# Altium schematic symbol library TTL74系列.SchLib: 649 symbols (part 4 of 6)
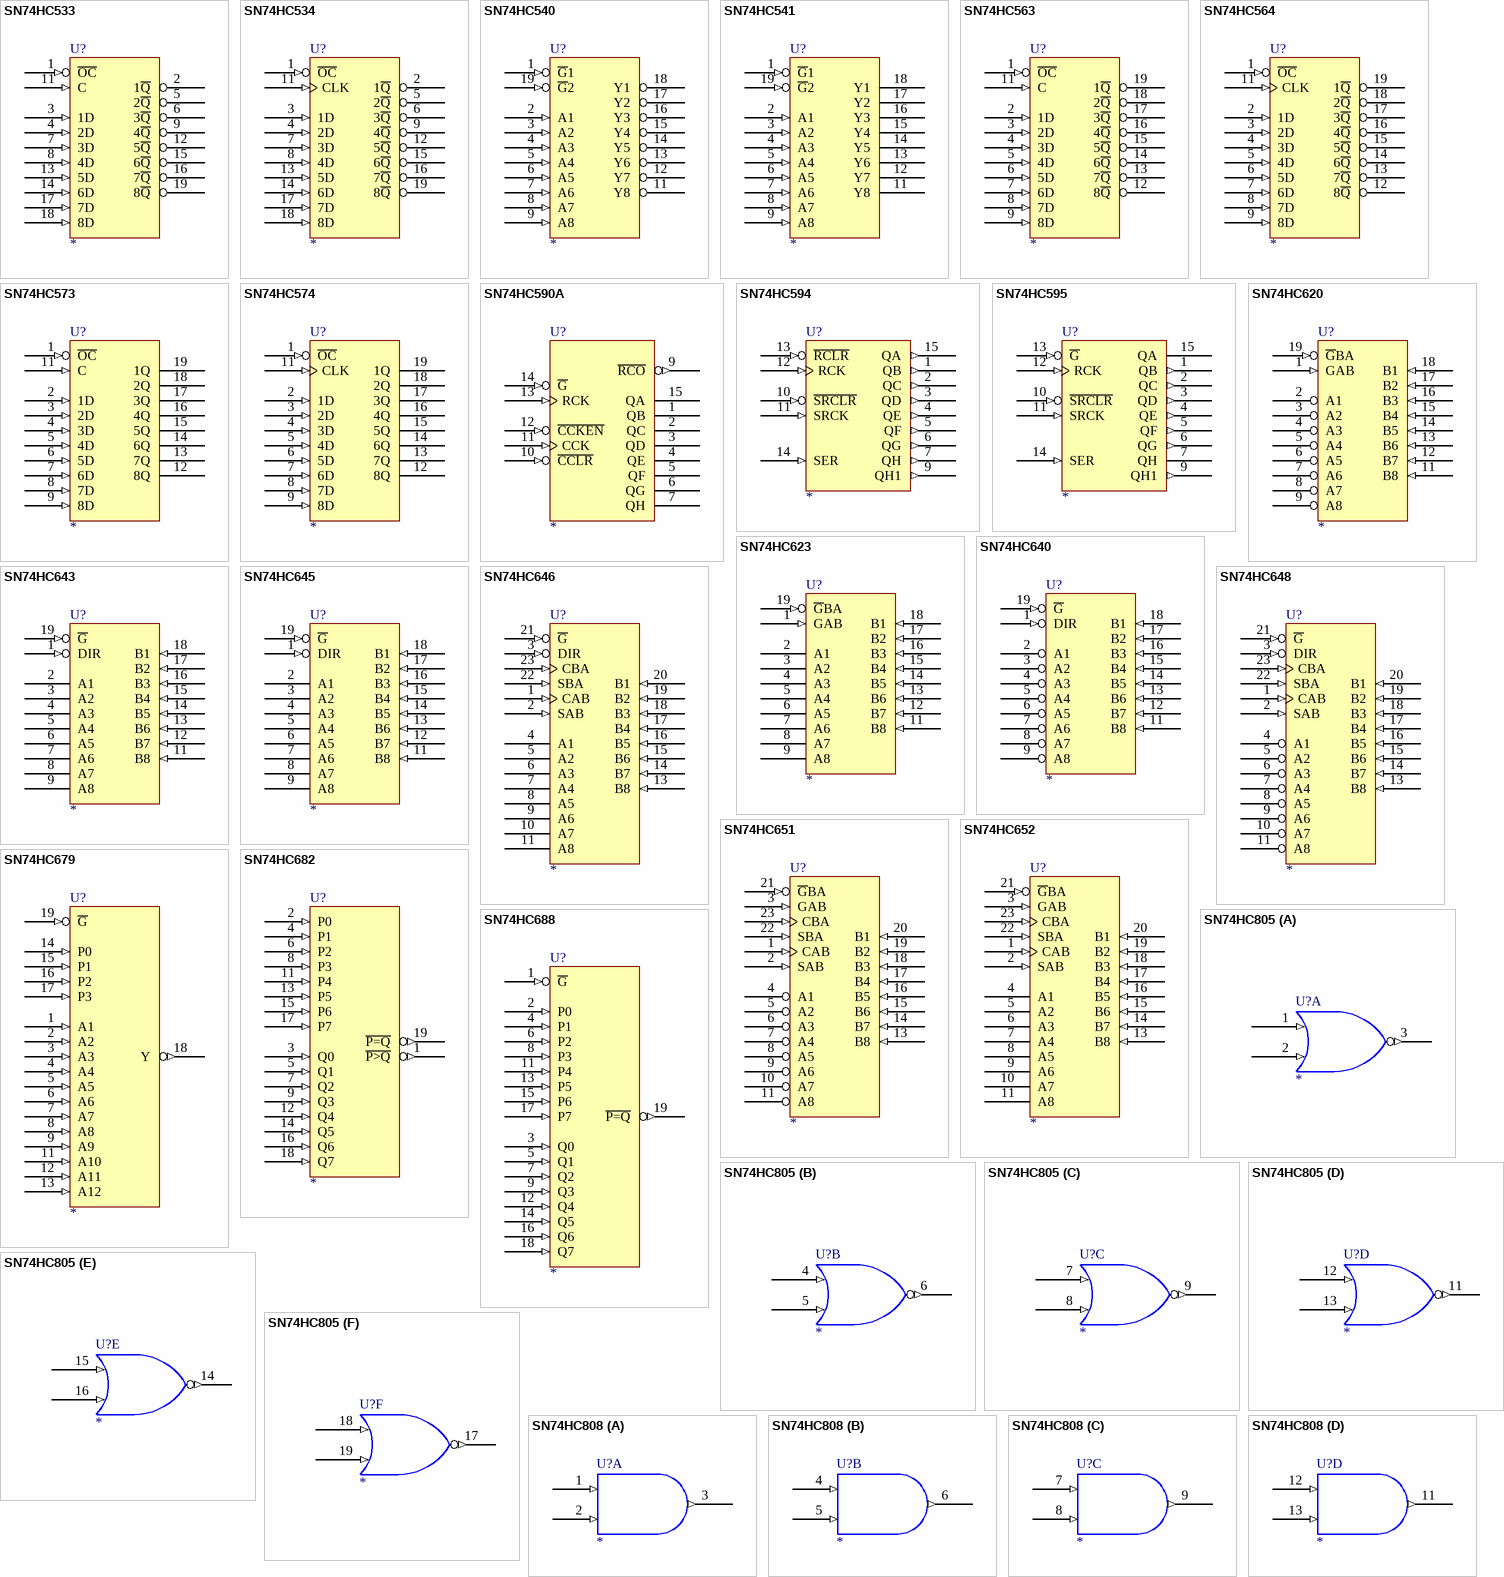
[diagram p33: symbols SN74HC533 to SN74HC808]

## SN74HC682
designator U?
8-BIT MAGNITUDE/IDENTITY COMPARATOR
footprint SO20W
footprint DIP-20
pins: 1 ~{P>Q} (out), 2 P0 (in), 3 Q0 (in), 4 P1 (in), 5 Q1 (in), 6 P2 (in), 7 Q2 (in), 8 P3 (in), 9 Q3 (in), 10 GND (power) hidden to GND, 11 P4 (in), 12 Q4 (in), 13 P5 (in), 14 Q5 (in), 15 P6 (in), 16 Q6 (in), 17 P7 (in), 18 Q7 (in), 19 ~{P=Q} (out), 20 VCC (power) hidden to VCC
1 alternate drawing of the same symbol

## SN74HC688
designator U?
8-BIT IDENTITY COMPARATOR
footprint SO20W
footprint DIP-20
pins: 1 ~{G} (in), 2 P0 (in), 3 Q0 (in), 4 P1 (in), 5 Q1 (in), 6 P2 (in), 7 Q2 (in), 8 P3 (in), 9 Q3 (in), 10 GND (power) hidden to GND, 11 P4 (in), 12 Q4 (in), 13 P5 (in), 14 Q5 (in), 15 P6 (in), 16 Q6 (in), 17 P7 (in), 18 Q7 (in), 19 ~{P=Q} (out), 20 VCC (power) hidden to VCC
1 alternate drawing of the same symbol

## SN74HC805
designator U?
HEX 2-IN NOR DRIVERS
footprint SO20W
footprint DIP-20
part A pins: 1 (in), 2 (in), 3 (out), 10 GND (power) hidden to GND, 20 VCC (power) hidden to VCC
part B pins: 4 (in), 5 (in), 6 (out), 10 GND (power) hidden to GND, 20 VCC (power) hidden to VCC
part C pins: 7 (in), 8 (in), 9 (out), 10 GND (power) hidden to GND, 20 VCC (power) hidden to VCC
part D pins: 10 GND (power) hidden to GND, 11 (out), 12 (in), 13 (in), 20 VCC (power) hidden to VCC
part E pins: 10 GND (power) hidden to GND, 14 (out), 15 (in), 16 (in), 20 VCC (power) hidden to VCC
part F pins: 10 GND (power) hidden to GND, 17 (out), 18 (in), 19 (in), 20 VCC (power) hidden to VCC
2 alternate drawings of the same symbol

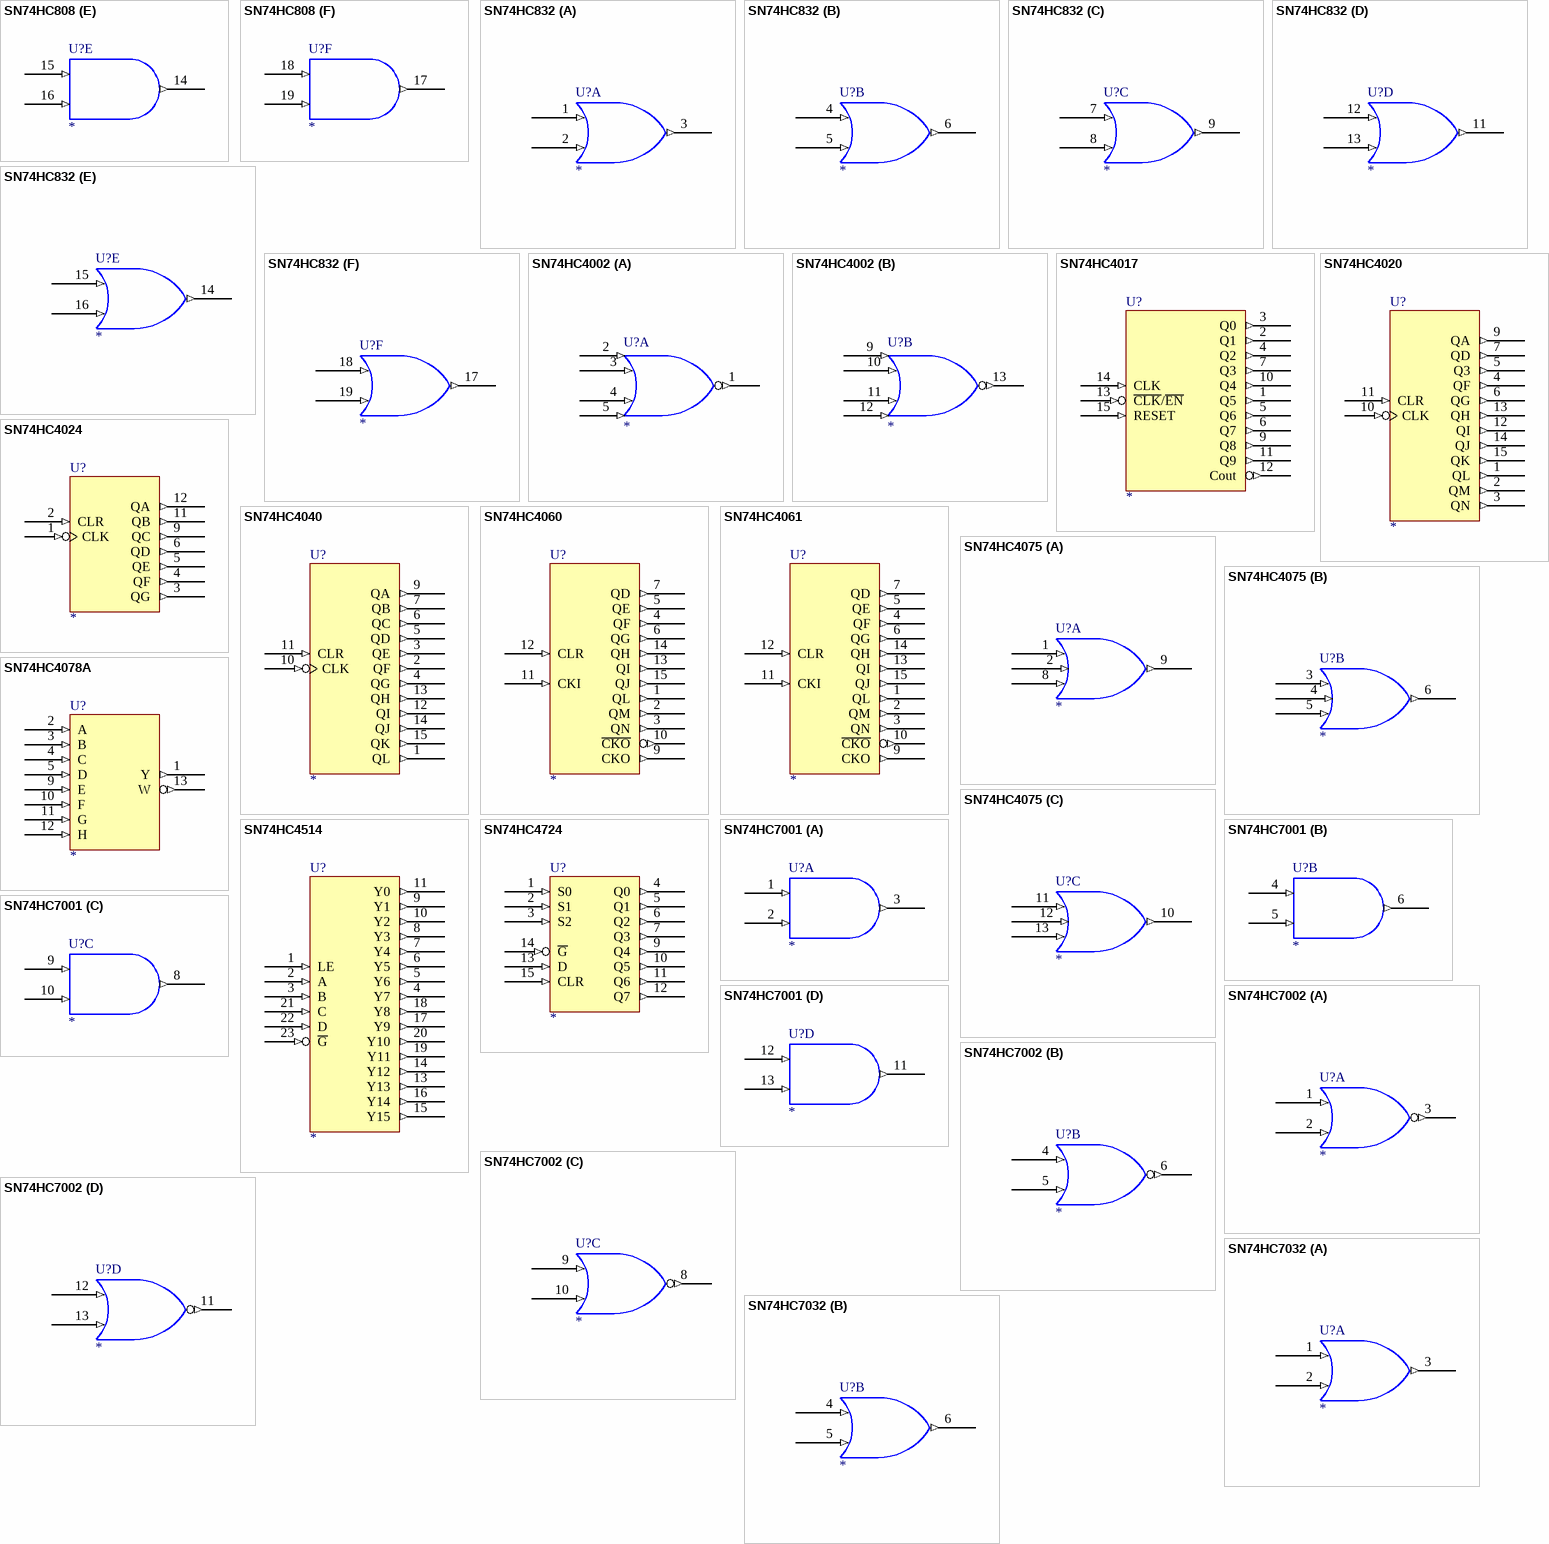
[diagram p16: symbols SN74HC808 to SN74HC7032]

## SN74HC808
designator U?
HEX 2-IN AND DRIVERS
footprint SO20W
footprint DIP-20
part A pins: 1 (in), 2 (in), 3 (out), 10 GND (power) hidden to GND, 20 VCC (power) hidden to VCC
part B pins: 4 (in), 5 (in), 6 (out), 10 GND (power) hidden to GND, 20 VCC (power) hidden to VCC
part C pins: 7 (in), 8 (in), 9 (out), 10 GND (power) hidden to GND, 20 VCC (power) hidden to VCC
part D pins: 10 GND (power) hidden to GND, 11 (out), 12 (in), 13 (in), 20 VCC (power) hidden to VCC
part E pins: 10 GND (power) hidden to GND, 14 (out), 15 (in), 16 (in), 20 VCC (power) hidden to VCC
part F pins: 10 GND (power) hidden to GND, 17 (out), 18 (in), 19 (in), 20 VCC (power) hidden to VCC
2 alternate drawings of the same symbol

## SN74HC832
designator U?
HEX 2-IN OR DRIVERS
footprint SO20W
footprint DIP-20
part A pins: 1 (in), 2 (in), 3 (out), 10 GND (power) hidden to GND, 20 VCC (power) hidden to VCC
part B pins: 4 (in), 5 (in), 6 (out), 10 GND (power) hidden to GND, 20 VCC (power) hidden to VCC
part C pins: 7 (in), 8 (in), 9 (out), 10 GND (power) hidden to GND, 20 VCC (power) hidden to VCC
part D pins: 10 GND (power) hidden to GND, 11 (out), 12 (in), 13 (in), 20 VCC (power) hidden to VCC
part E pins: 10 GND (power) hidden to GND, 14 (out), 15 (in), 16 (in), 20 VCC (power) hidden to VCC
part F pins: 10 GND (power) hidden to GND, 17 (out), 18 (in), 19 (in), 20 VCC (power) hidden to VCC
2 alternate drawings of the same symbol

## SN74HC4002
designator U?
Dual 4-INPUT NOR GATE
footprint SO14
footprint DIP-14
part A pins: 1 (out), 2 (in), 3 (in), 4 (in), 5 (in), 7 GND (power) hidden to GND, 14 VCC (power) hidden to VCC
part B pins: 7 GND (power) hidden to GND, 9 (in), 10 (in), 11 (in), 12 (in), 13 (out), 14 VCC (power) hidden to VCC
2 alternate drawings of the same symbol

## SN74HC4017
designator U?
DECADE COUNTER/DIVIDER
footprint DIP-16
pins: 1 Q5 (out), 2 Q1 (out), 3 Q0 (out), 4 Q2 (out), 5 Q6 (out), 6 Q7 (out), 7 Q3 (out), 8 GND (power) hidden to GND, 9 Q8 (out), 10 Q4 (out), 11 Q9 (out), 12 Cout (out), 13 ~{CLK}/~{EN} (in), 14 CLK (in), 15 RESET (in), 16 VCC (power) hidden to VCC
1 alternate drawing of the same symbol

## SN74HC4020
designator U?
14-BIT BINARY COUNTER
footprint SO16
footprint DIP-16
pins: 1 QL (out), 2 QM (out), 3 QN (out), 4 QF (out), 5 Q3 (out), 6 QG (out), 7 QD (out), 8 GND (power) hidden to GND, 9 QA (out), 10 CLK (in), 11 CLR (in), 12 QI (out), 13 QH (out), 14 QJ (out), 15 QK (out), 16 VCC (power) hidden to VCC
1 alternate drawing of the same symbol

## SN74HC4024
designator U?
ASYNCHRONOUS 7-BIT BINARY COUNTERS
footprint SO14
footprint DIP-14
pins: 1 CLK (in), 2 CLR (in), 3 QG (out), 4 QF (out), 5 QE (out), 6 QD (out), 7 GND (power) hidden to GND, 9 QC (out), 11 QB (out), 12 QA (out), 14 VCC (power) hidden to VCC
1 alternate drawing of the same symbol

## SN74HC4040
designator U?
ASYNCHRONOUS 12-BIT BINARY COUNTERS
footprint SO16
footprint DIP-16
pins: 1 QL (out), 2 QF (out), 3 QE (out), 4 QG (out), 5 QD (out), 6 QC (out), 7 QB (out), 8 GND (power) hidden to GND, 9 QA (out), 10 CLK (in), 11 CLR (in), 12 QI (out), 13 QH (out), 14 QJ (out), 15 QK (out), 16 VCC (power) hidden to VCC
1 alternate drawing of the same symbol

## SN74HC4060
designator U?
ASYNCHRONOUS 14-STAGE BINARY COUNTERS AND OSCILATORS
footprint SO16
footprint DIP-16
pins: 1 QL (out), 2 QM (out), 3 QN (out), 4 QF (out), 5 QE (out), 6 QG (out), 7 QD (out), 8 GND (power) hidden to GND, 9 CKO (out), 10 ~{CKO} (out), 11 CKI (in), 12 CLR (in), 13 QI (out), 14 QH (out), 15 QJ (out), 16 VCC (power) hidden to VCC
1 alternate drawing of the same symbol

## SN74HC4061
designator U?
ASYNCHRONOUS 14-STAGE BINARY COUNTERS AND OSCILATORS
footprint SO16
footprint DIP-16
pins: 1 QL (out), 2 QM (out), 3 QN (out), 4 QF (out), 5 QE (out), 6 QG (out), 7 QD (out), 8 GND (power) hidden to GND, 9 CKO (out), 10 ~{CKO} (out), 11 CKI (in), 12 CLR (in), 13 QI (out), 14 QH (out), 15 QJ (out), 16 VCC (power) hidden to VCC
1 alternate drawing of the same symbol

## SN74HC4075
designator U?
TRIPLE 3-INPUT OR GATE
footprint SO14
footprint DIP-14
part A pins: 1 (in), 2 (in), 7 GND (power) hidden to GND, 8 (in), 9 (out), 14 VCC (power) hidden to VCC
part B pins: 3 (in), 4 (in), 5 (in), 6 (out), 7 GND (power) hidden to GND, 14 VCC (power) hidden to VCC
part C pins: 7 GND (power) hidden to GND, 10 (out), 11 (in), 12 (in), 13 (in), 14 VCC (power) hidden to VCC
2 alternate drawings of the same symbol

## SN74HC4078A
designator U?
8-INPUT OR/NOR GATE
footprint SO14
footprint DIP-14
pins: 1 Y (out), 2 A (in), 3 B (in), 4 C (in), 5 D (in), 7 GND (power) hidden to GND, 9 E (in), 10 F (in), 11 G (in), 12 H (in), 13 W (out), 14 VCC (power) hidden to VCC
1 alternate drawing of the same symbol

## SN74HC4514
designator U?
4-LINE TO 16-LINE DECODER/DEMULTIPLEXERS WITH ADDRESS LATCHES
footprint SO24W
footprint DIP-24
pins: 1 LE (in), 2 A (in), 3 B (in), 4 Y7 (out), 5 Y6 (out), 6 Y5 (out), 7 Y4 (out), 8 Y3 (out), 9 Y1 (out), 10 Y2 (out), 11 Y0 (out), 12 GND (power) hidden to GND, 13 Y13 (out), 14 Y12 (out), 15 Y15 (out), 16 Y14 (out), 17 Y9 (out), 18 Y8 (out), 19 Y11 (out), 20 Y10 (out), 21 C (in), 22 D (in), 23 ~{G} (in), 24 VCC (power) hidden to VCC
1 alternate drawing of the same symbol

## SN74HC4724
designator U?
8-BIT ADDRESSABLE LARCHES
footprint DIP-16
pins: 1 S0 (in), 2 S1 (in), 3 S2 (in), 4 Q0 (out), 5 Q1 (out), 6 Q2 (out), 7 Q3 (out), 8 GND (power) hidden to GND, 9 Q4 (out), 10 Q5 (out), 11 Q6 (out), 12 Q7 (out), 13 D (in), 14 ~{G} (in), 15 CLR (in), 16 VCC (power) hidden to VCC
1 alternate drawing of the same symbol

## SN74HC7001
designator U?
Quad 2-IN Pos AND G SCH INPUTS
footprint SO14
footprint DIP-14
part A pins: 1 (in), 2 (in), 3 (out), 7 GND (power) hidden to GND, 14 VCC (power) hidden to VCC
part B pins: 4 (in), 5 (in), 6 (out), 7 GND (power) hidden to GND, 14 VCC (power) hidden to VCC
part C pins: 7 GND (power) hidden to GND, 8 (out), 9 (in), 10 (in), 14 VCC (power) hidden to VCC
part D pins: 7 GND (power) hidden to GND, 11 (out), 12 (in), 13 (in), 14 VCC (power) hidden to VCC
2 alternate drawings of the same symbol

## SN74HC7002
designator U?
Quad 2-IN Pos NOR G SCH INPUTS
footprint SO14
footprint DIP-14
part A pins: 1 (in), 2 (in), 3 (out), 7 GND (power) hidden to GND, 14 VCC (power) hidden to VCC
part B pins: 4 (in), 5 (in), 6 (out), 7 GND (power) hidden to GND, 14 VCC (power) hidden to VCC
part C pins: 7 GND (power) hidden to GND, 8 (out), 9 (in), 10 (in), 14 VCC (power) hidden to VCC
part D pins: 7 GND (power) hidden to GND, 11 (out), 12 (in), 13 (in), 14 VCC (power) hidden to VCC
2 alternate drawings of the same symbol

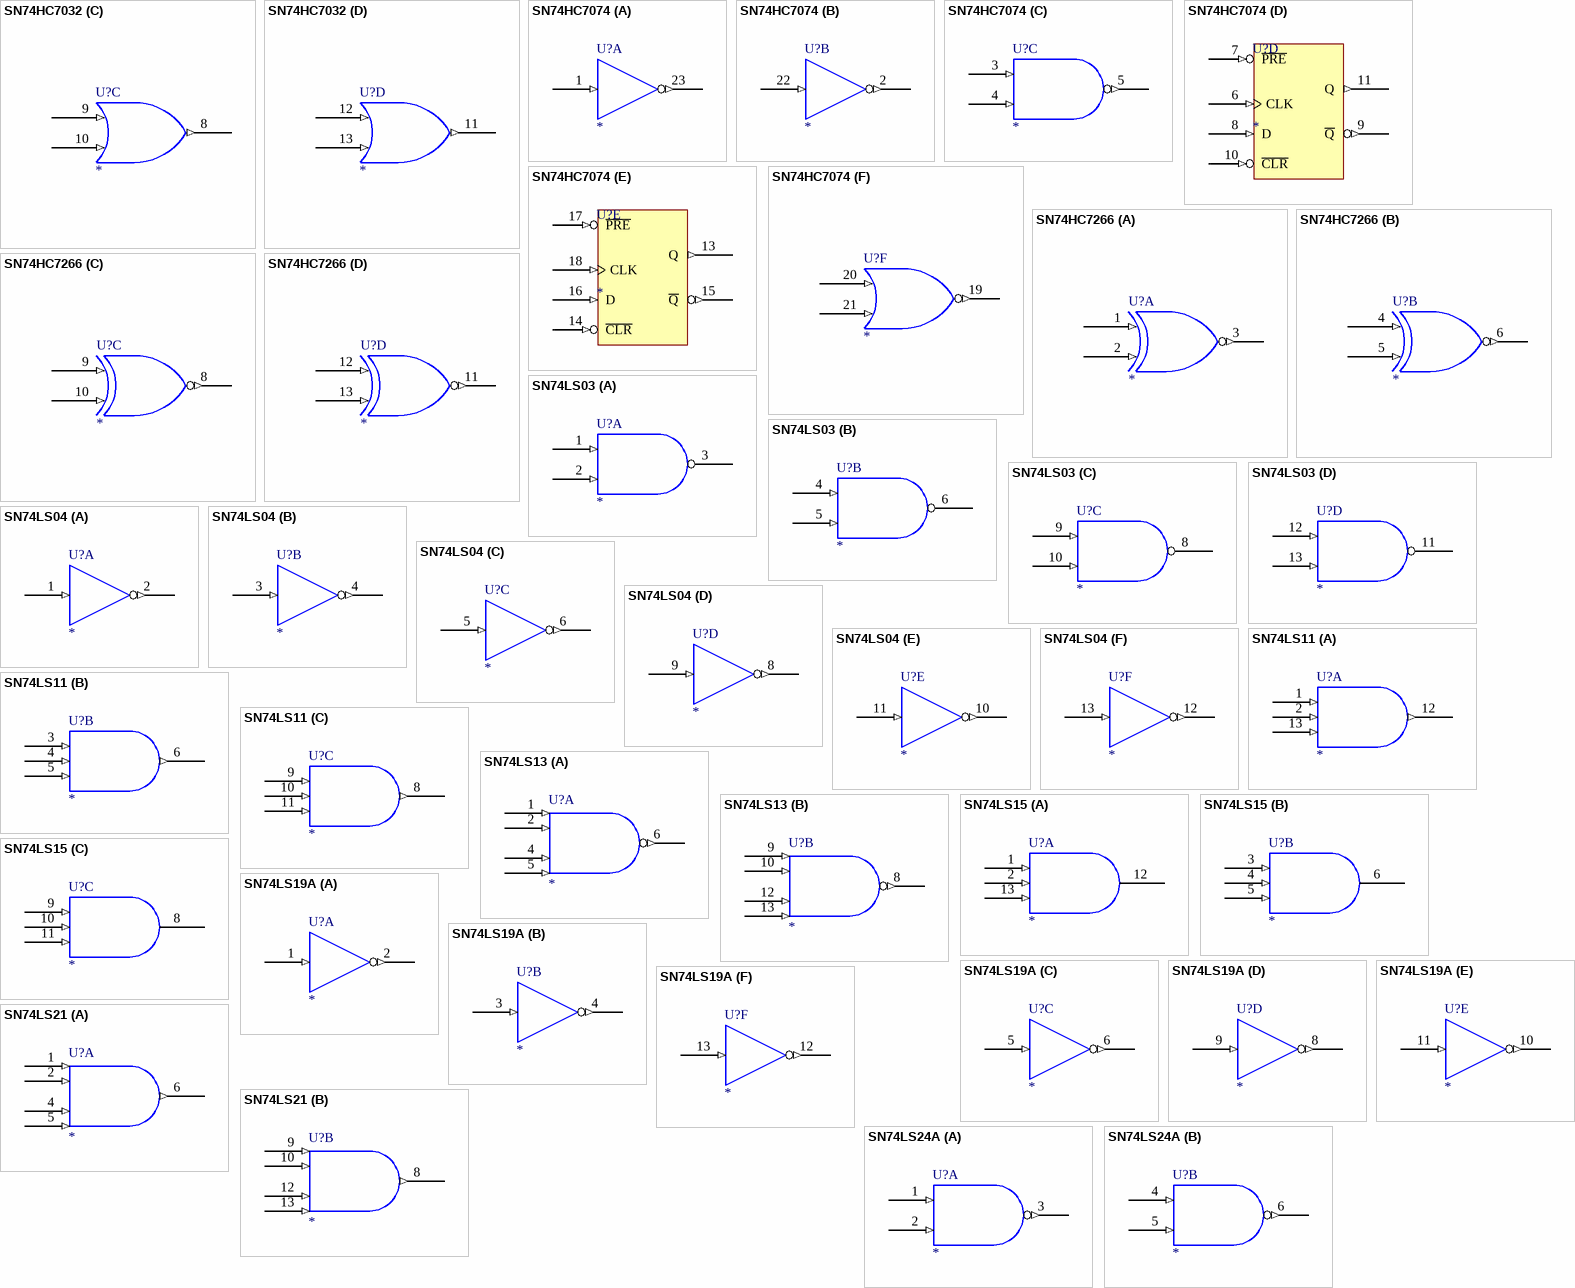
[diagram p17: symbols SN74HC7032 to SN74LS24A]

## SN74HC7032
designator U?
Quad 2-IN Pos OR G SCH INPUTS
footprint SO14
footprint DIP-14
part A pins: 1 (in), 2 (in), 3 (out), 7 GND (power) hidden to GND, 14 VCC (power) hidden to VCC
part B pins: 4 (in), 5 (in), 6 (out), 7 GND (power) hidden to GND, 14 VCC (power) hidden to VCC
part C pins: 7 GND (power) hidden to GND, 8 (out), 9 (in), 10 (in), 14 VCC (power) hidden to VCC
part D pins: 7 GND (power) hidden to GND, 11 (out), 12 (in), 13 (in), 14 VCC (power) hidden to VCC
2 alternate drawings of the same symbol

## SN74HC7074
designator U?
6-SECTION MULTIFUNCTION NAND INVERT NOR FF
footprint SO24W
footprint DIP-24
part A pins: 1 (in), 12 GND (power) hidden to GND, 23 (out), 24 VCC (power) hidden to VCC
part B pins: 2 (out), 12 GND (power) hidden to GND, 22 (in), 24 VCC (power) hidden to VCC
part C pins: 3 (in), 4 (in), 5 (out), 12 GND (power) hidden to GND, 24 VCC (power) hidden to VCC
part D pins: 6 CLK (in), 7 ~{PRE} (in), 8 D (in), 9 ~{Q} (out), 10 ~{CLR} (in), 11 Q (out), 12 GND (power) hidden to GND, 24 VCC (power) hidden to VCC
part E pins: 12 GND (power) hidden to GND, 13 Q (out), 14 ~{CLR} (in), 15 ~{Q} (out), 16 D (in), 17 ~{PRE} (in), 18 CLK (in), 24 VCC (power) hidden to VCC
part F pins: 12 GND (power) hidden to GND, 19 (out), 20 (in), 21 (in), 24 VCC (power) hidden to VCC
2 alternate drawings of the same symbol

## SN74HC7266
designator U?
QUAD 2-IN XNOR G
footprint SO14
footprint DIP-14
part A pins: 1 (in), 2 (in), 3 (out), 7 GND (power) hidden to GND, 14 VCC (power) hidden to VCC
part B pins: 4 (in), 5 (in), 6 (out), 7 GND (power) hidden to GND, 14 VCC (power) hidden to VCC
part C pins: 7 GND (power) hidden to GND, 8 (out), 9 (in), 10 (in), 14 VCC (power) hidden to VCC
part D pins: 7 GND (power) hidden to GND, 11 (out), 12 (in), 13 (in), 14 VCC (power) hidden to VCC
1 alternate drawing of the same symbol

## SN74LS03
designator U?
Quad 2-IN Pos Nand G OCO
footprint SO14
footprint DIP-14
part A pins: 1 (in), 2 (in), 3 (oc), 7 GND (power) hidden to GND, 14 VCC (power) hidden to VCC
part B pins: 4 (in), 5 (in), 6 (oc), 7 GND (power) hidden to GND, 14 VCC (power) hidden to VCC
part C pins: 7 GND (power) hidden to GND, 8 (oc), 9 (in), 10 (in), 14 VCC (power) hidden to VCC
part D pins: 7 GND (power) hidden to GND, 11 (oc), 12 (in), 13 (in), 14 VCC (power) hidden to VCC
2 alternate drawings of the same symbol

## SN74LS04
designator U?
Hex Inverters
footprint SO14
footprint DIP-14
part A pins: 1 (in), 2 (out), 7 GND (power) hidden to GND, 14 VCC (power) hidden to VCC
part B pins: 3 (in), 4 (out), 7 GND (power) hidden to GND, 14 VCC (power) hidden to VCC
part C pins: 5 (in), 6 (out), 7 GND (power) hidden to GND, 14 VCC (power) hidden to VCC
part D pins: 7 GND (power) hidden to GND, 8 (out), 9 (in), 14 VCC (power) hidden to VCC
part E pins: 7 GND (power) hidden to GND, 10 (out), 11 (in), 14 VCC (power) hidden to VCC
part F pins: 7 GND (power) hidden to GND, 12 (out), 13 (in), 14 VCC (power) hidden to VCC
2 alternate drawings of the same symbol

## SN74LS11
designator U?
Triple 3-IN Pos And G
footprint SO14
footprint DIP-14
part A pins: 1 (in), 2 (in), 7 GND (power) hidden to GND, 12 (out), 13 (in), 14 VCC (power) hidden to VCC
part B pins: 3 (in), 4 (in), 5 (in), 6 (out), 7 GND (power) hidden to GND, 14 VCC (power) hidden to VCC
part C pins: 7 GND (power) hidden to GND, 8 (out), 9 (in), 10 (in), 11 (in), 14 VCC (power) hidden to VCC
2 alternate drawings of the same symbol

## SN74LS13
designator U?
Dual 4-IN Pos Nand G SCH
footprint SO14
footprint DIP-14
part A pins: 1 (in), 2 (in), 4 (in), 5 (in), 6 (out), 7 GND (power) hidden to GND, 14 VCC (power) hidden to VCC
part B pins: 7 GND (power) hidden to GND, 8 (out), 9 (in), 10 (in), 12 (in), 13 (in), 14 VCC (power) hidden to VCC
2 alternate drawings of the same symbol

## SN74LS15
designator U?
Triple 3-IN Pos And G OCO
footprint SO14
footprint DIP-14
part A pins: 1 (in), 2 (in), 7 GND (power) hidden to GND, 12 (oc), 13 (in), 14 VCC (power) hidden to VCC
part B pins: 3 (in), 4 (in), 5 (in), 6 (oc), 7 GND (power) hidden to GND, 14 VCC (power) hidden to VCC
part C pins: 7 GND (power) hidden to GND, 8 (oc), 9 (in), 10 (in), 11 (in), 14 VCC (power) hidden to VCC
2 alternate drawings of the same symbol

## SN74LS19A
designator U?
Hex Inverter Totem
footprint SO14
footprint DIP-14
part A pins: 1 (in), 2 (out), 7 GND (power) hidden to GND, 14 VCC (power) hidden to VCC
part B pins: 3 (in), 4 (out), 7 GND (power) hidden to GND, 14 VCC (power) hidden to VCC
part C pins: 5 (in), 6 (out), 7 GND (power) hidden to GND, 14 VCC (power) hidden to VCC
part D pins: 7 GND (power) hidden to GND, 8 (out), 9 (in), 14 VCC (power) hidden to VCC
part E pins: 7 GND (power) hidden to GND, 10 (out), 11 (in), 14 VCC (power) hidden to VCC
part F pins: 7 GND (power) hidden to GND, 12 (out), 13 (in), 14 VCC (power) hidden to VCC
2 alternate drawings of the same symbol

## SN74LS21
designator U?
Dual 4-IN Pos And G
footprint SO14
footprint DIP-14
part A pins: 1 (in), 2 (in), 4 (in), 5 (in), 6 (out), 7 GND (power) hidden to GND, 14 VCC (power) hidden to VCC
part B pins: 7 GND (power) hidden to GND, 8 (out), 9 (in), 10 (in), 12 (in), 13 (in), 14 VCC (power) hidden to VCC
2 alternate drawings of the same symbol

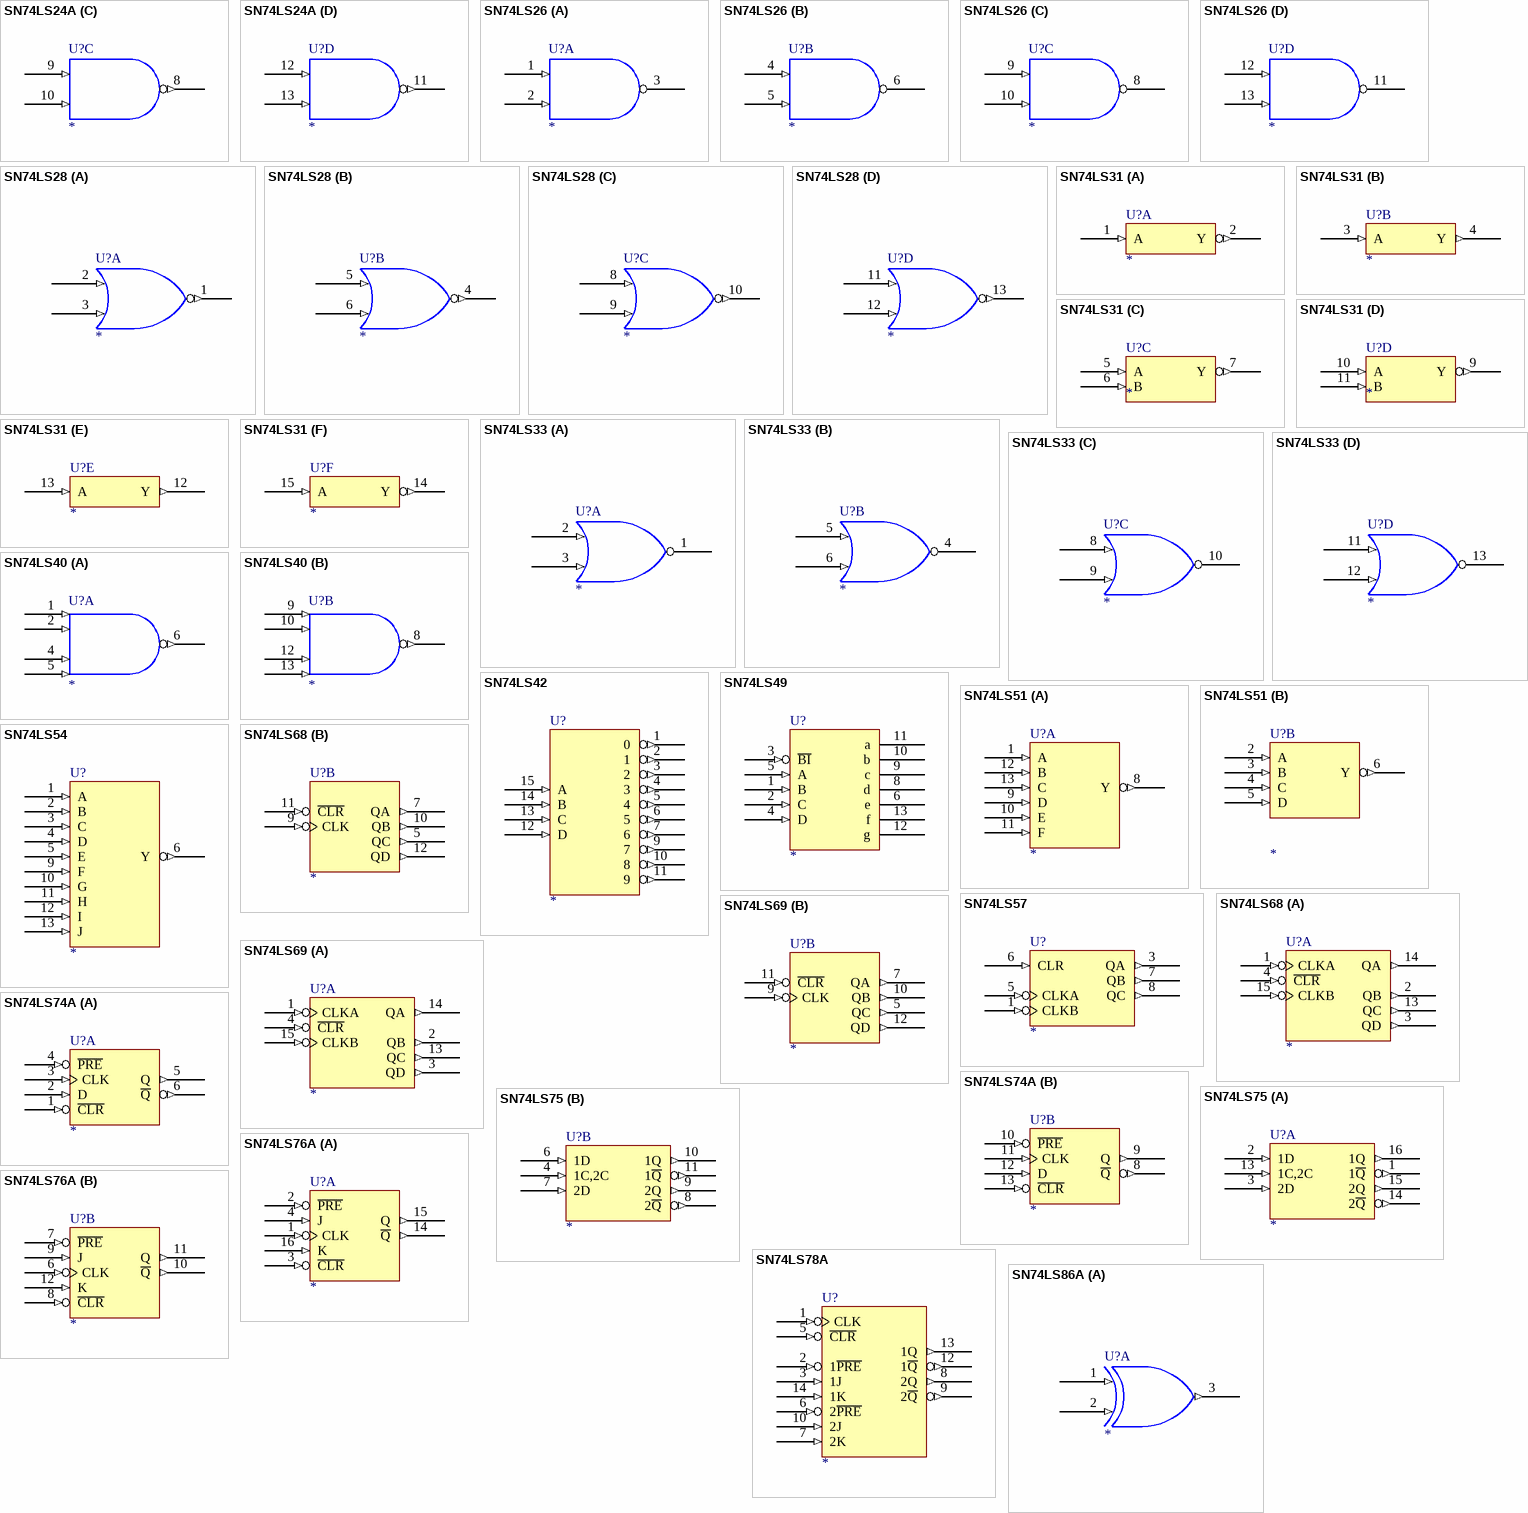
[diagram p18: symbols SN74LS24A to SN74LS86A]

## SN74LS24A
designator U?
Quad 2-IN Pos Nand G SCH totem
footprint SO14
footprint DIP-14
part A pins: 1 (in), 2 (in), 3 (out), 7 GND (power) hidden to GND, 14 VCC (power) hidden to VCC
part B pins: 4 (in), 5 (in), 6 (out), 7 GND (power) hidden to GND, 14 VCC (power) hidden to VCC
part C pins: 7 GND (power) hidden to GND, 8 (out), 9 (in), 10 (in), 14 VCC (power) hidden to VCC
part D pins: 7 GND (power) hidden to GND, 11 (out), 12 (in), 13 (in), 14 VCC (power) hidden to VCC
2 alternate drawings of the same symbol

## SN74LS26
designator U?
Quad 2-IN Pos Nand G HV INTF
footprint SO14
footprint DIP-14
part A pins: 1 (in), 2 (in), 3 (oc), 7 GND (power) hidden to GND, 14 VCC (power) hidden to VCC
part B pins: 4 (in), 5 (in), 6 (oc), 7 GND (power) hidden to GND, 14 VCC (power) hidden to VCC
part C pins: 7 GND (power) hidden to GND, 8 (oc), 9 (in), 10 (in), 14 VCC (power) hidden to VCC
part D pins: 7 GND (power) hidden to GND, 11 (oc), 12 (in), 13 (in), 14 VCC (power) hidden to VCC
2 alternate drawings of the same symbol

## SN74LS28
designator U?
Quad 2-IN Pos Nor G BUF
footprint SO14
footprint DIP-14
part A pins: 1 (out), 2 (in), 3 (in), 7 GND (power) hidden to GND, 14 VCC (power) hidden to VCC
part B pins: 4 (out), 5 (in), 6 (in), 7 GND (power) hidden to GND, 14 VCC (power) hidden to VCC
part C pins: 7 GND (power) hidden to GND, 8 (in), 9 (in), 10 (out), 14 VCC (power) hidden to VCC
part D pins: 7 GND (power) hidden to GND, 11 (in), 12 (in), 13 (out), 14 VCC (power) hidden to VCC
2 alternate drawings of the same symbol

## SN74LS31
designator U?
Delay Elements
footprint SO16
footprint DIP-16
part A pins: 1 A (in), 2 Y (out), 8 GND (power) hidden to GND, 16 VCC (power) hidden to VCC
part B pins: 3 A (in), 4 Y (out), 8 GND (power) hidden to GND, 16 VCC (power) hidden to VCC
part C pins: 5 A (in), 6 B (in), 7 Y (out), 8 GND (power) hidden to GND, 16 VCC (power) hidden to VCC
part D pins: 8 GND (power) hidden to GND, 9 Y (out), 10 A (in), 11 B (in), 16 VCC (power) hidden to VCC
part E pins: 8 GND (power) hidden to GND, 12 Y (out), 13 A (in), 16 VCC (power) hidden to VCC
part F pins: 8 GND (power) hidden to GND, 14 Y (out), 15 A (in), 16 VCC (power) hidden to VCC
1 alternate drawing of the same symbol

## SN74LS33
designator U?
Quad 2-IN Pos Nor G BUF OCO
footprint SO14
footprint DIP-14
part A pins: 1 (oc), 2 (in), 3 (in), 7 GND (power) hidden to GND, 14 VCC (power) hidden to VCC
part B pins: 4 (oc), 5 (in), 6 (in), 7 GND (power) hidden to GND, 14 VCC (power) hidden to VCC
part C pins: 7 GND (power) hidden to GND, 8 (in), 9 (in), 10 (oc), 14 VCC (power) hidden to VCC
part D pins: 7 GND (power) hidden to GND, 11 (in), 12 (in), 13 (oc), 14 VCC (power) hidden to VCC
2 alternate drawings of the same symbol

## SN74LS40
designator U?
Dual 4-in Pos Nand G BUF
footprint SO14
footprint DIP-14
part A pins: 1 (in), 2 (in), 4 (in), 5 (in), 6 (out), 7 GND (power) hidden to GND, 14 VCC (power) hidden to VCC
part B pins: 7 GND (power) hidden to GND, 8 (out), 9 (in), 10 (in), 12 (in), 13 (in), 14 VCC (power) hidden to VCC
2 alternate drawings of the same symbol

## SN74LS42
designator U?
4-line BCD to 10-line decimal Dec
footprint SO16
footprint DIP-16
pins: 1 0 (out), 2 1 (out), 3 2 (out), 4 3 (out), 5 4 (out), 6 5 (out), 7 6 (out), 8 GND (power) hidden to GND, 9 7 (out), 10 8 (out), 11 9 (out), 12 D (in), 13 C (in), 14 B (in), 15 A (in), 16 VCC (power) hidden to VCC
1 alternate drawing of the same symbol

## SN74LS49
designator U?
BCD-To-SEVEN-SEGMENT DEC DRV
footprint SO14
footprint DIP-14
pins: 1 B (in), 2 C (in), 3 ~{BI} (in), 4 D (in), 5 A (in), 6 e (oc), 7 GND (power) hidden to GND, 8 d (oc), 9 c (oc), 10 b (oc), 11 a (oc), 12 g (oc), 13 f (oc), 14 VCC (power) hidden to VCC
1 alternate drawing of the same symbol

## SN74LS51
designator U?
DUAL 2-WIDE 2&3-IN AND-OR-INVERT G
footprint SO14
footprint DIP-14
part A pins: 1 A (in), 7 GND (power) hidden to GND, 8 Y (out), 9 D (in), 10 E (in), 11 F (in), 12 B (in), 13 C (in), 14 VCC (power) hidden to VCC
part B pins: 2 A (in), 3 B (in), 4 C (in), 5 D (in), 6 Y (out), 7 GND (power) hidden to GND, 14 VCC (power) hidden to VCC
1 alternate drawing of the same symbol

## SN74LS54
designator U?
4-WIDE 2-IN AND-OR-INVERT G
footprint SO14
footprint DIP-14
pins: 1 A (in), 2 B (in), 3 C (in), 4 D (in), 5 E (in), 6 Y (out), 7 GND (power) hidden to GND, 9 F (in), 10 G (in), 11 H (in), 12 I (in), 13 J (in), 14 VCC (power) hidden to VCC
1 alternate drawing of the same symbol

## SN74LS57
designator U?
FREQUENCY DIVIDERS
footprint DIP-8
pins: 1 CLKB (in), 2 VCC (power) hidden to VCC, 3 QA (out), 4 GND (power) hidden to GND, 5 CLKA (in), 6 CLR (in), 7 QB (out), 8 QC (out)
1 alternate drawing of the same symbol

## SN74LS68
designator U?
DUAL 4-BIT DECADE OR BINARY CNT
footprint SO16
footprint DIP-16
part A pins: 1 CLKA (in), 2 QB (out), 3 QD (out), 4 ~{CLR} (in), 8 GND (power) hidden to GND, 13 QC (out), 14 QA (out), 15 CLKB (in), 16 VCC (power) hidden to VCC
part B pins: 5 QC (out), 7 QA (out), 8 GND (power) hidden to GND, 9 CLK (in), 10 QB (out), 11 ~{CLR} (in), 12 QD (out), 16 VCC (power) hidden to VCC
1 alternate drawing of the same symbol

## SN74LS69
designator U?
DUAL 4-BIT DECADE OR BINARY CNT
footprint SO16
footprint DIP-16
part A pins: 1 CLKA (in), 2 QB (out), 3 QD (out), 4 ~{CLR} (in), 8 GND (power) hidden to GND, 13 QC (out), 14 QA (out), 15 CLKB (in), 16 VCC (power) hidden to VCC
part B pins: 5 QC (out), 7 QA (out), 8 GND (power) hidden to GND, 9 CLK (in), 10 QB (out), 11 ~{CLR} (in), 12 QD (out), 16 VCC (power) hidden to VCC
1 alternate drawing of the same symbol

## SN74LS74A
designator U?
DUAL D PET FF RS CR
footprint SO14
footprint DIP-14
part A pins: 1 ~{CLR} (in), 2 D (in), 3 CLK (in), 4 ~{PRE} (in), 5 Q (out), 6 ~{Q} (out), 7 GND (power) hidden to GND, 14 VCC (power) hidden to VCC
part B pins: 7 GND (power) hidden to GND, 8 ~{Q} (out), 9 Q (out), 10 ~{PRE} (in), 11 CLK (in), 12 D (in), 13 ~{CLR} (in), 14 VCC (power) hidden to VCC
1 alternate drawing of the same symbol

## SN74LS75
designator U?
4-BIT BISTABLE LCH
footprint SO16
footprint DIP-16
part A pins: 1 1~{Q} (out), 2 1D (in), 3 2D (in), 5 VCC (power) hidden to VCC, 12 GND (power) hidden to GND, 13 1C,2C (in), 14 2~{Q} (out), 15 2Q (out), 16 1Q (out)
part B pins: 4 1C,2C (in), 5 VCC (power) hidden to VCC, 6 1D (in), 7 2D (in), 8 2~{Q} (out), 9 2Q (out), 10 1Q (out), 11 1~{Q} (out), 12 GND (power) hidden to GND
1 alternate drawing of the same symbol

## SN74LS76A
designator U?
DUAL J-K NET FF RS CR
footprint SO16
footprint DIP-16
part A pins: 1 CLK (in), 2 ~{PRE} (in), 3 ~{CLR} (in), 4 J (in), 5 VCC (power) hidden to VCC, 13 GND (power) hidden to GND, 14 ~{Q} (out), 15 Q (out), 16 K (in)
part B pins: 5 VCC (power) hidden to VCC, 6 CLK (in), 7 ~{PRE} (in), 8 ~{CLR} (in), 9 J (in), 10 ~{Q} (out), 11 Q (out), 12 K (in), 13 GND (power) hidden to GND
1 alternate drawing of the same symbol

## SN74LS78A
designator U?
DUAL J-K FF RS COM CLK COM CR
footprint SO14
footprint DIP-14
pins: 1 CLK (in), 2 1~{PRE} (in), 3 1J (in), 4 VCC (power) hidden to VCC, 5 ~{CLR} (in), 6 2~{PRE} (in), 7 2K (in), 8 2Q (out), 9 2~{Q} (out), 10 2J (in), 11 GND (power) hidden to GND, 12 1~{Q} (out), 13 1Q (out), 14 1K (in)
1 alternate drawing of the same symbol
